# Altium footprint library PART.PcbLib: 407 footprints (part 11 of 26)
Each footprint in its own frame and in the unit in brackets; x right, y up, seen from the top. Pads: shape width x height; smd on the part's side, far side on the other; paste and mask are expansions set on the pad; w line width, h text height; cw(c..) or ccw(c..) is an arc to the next point about the centre after c.
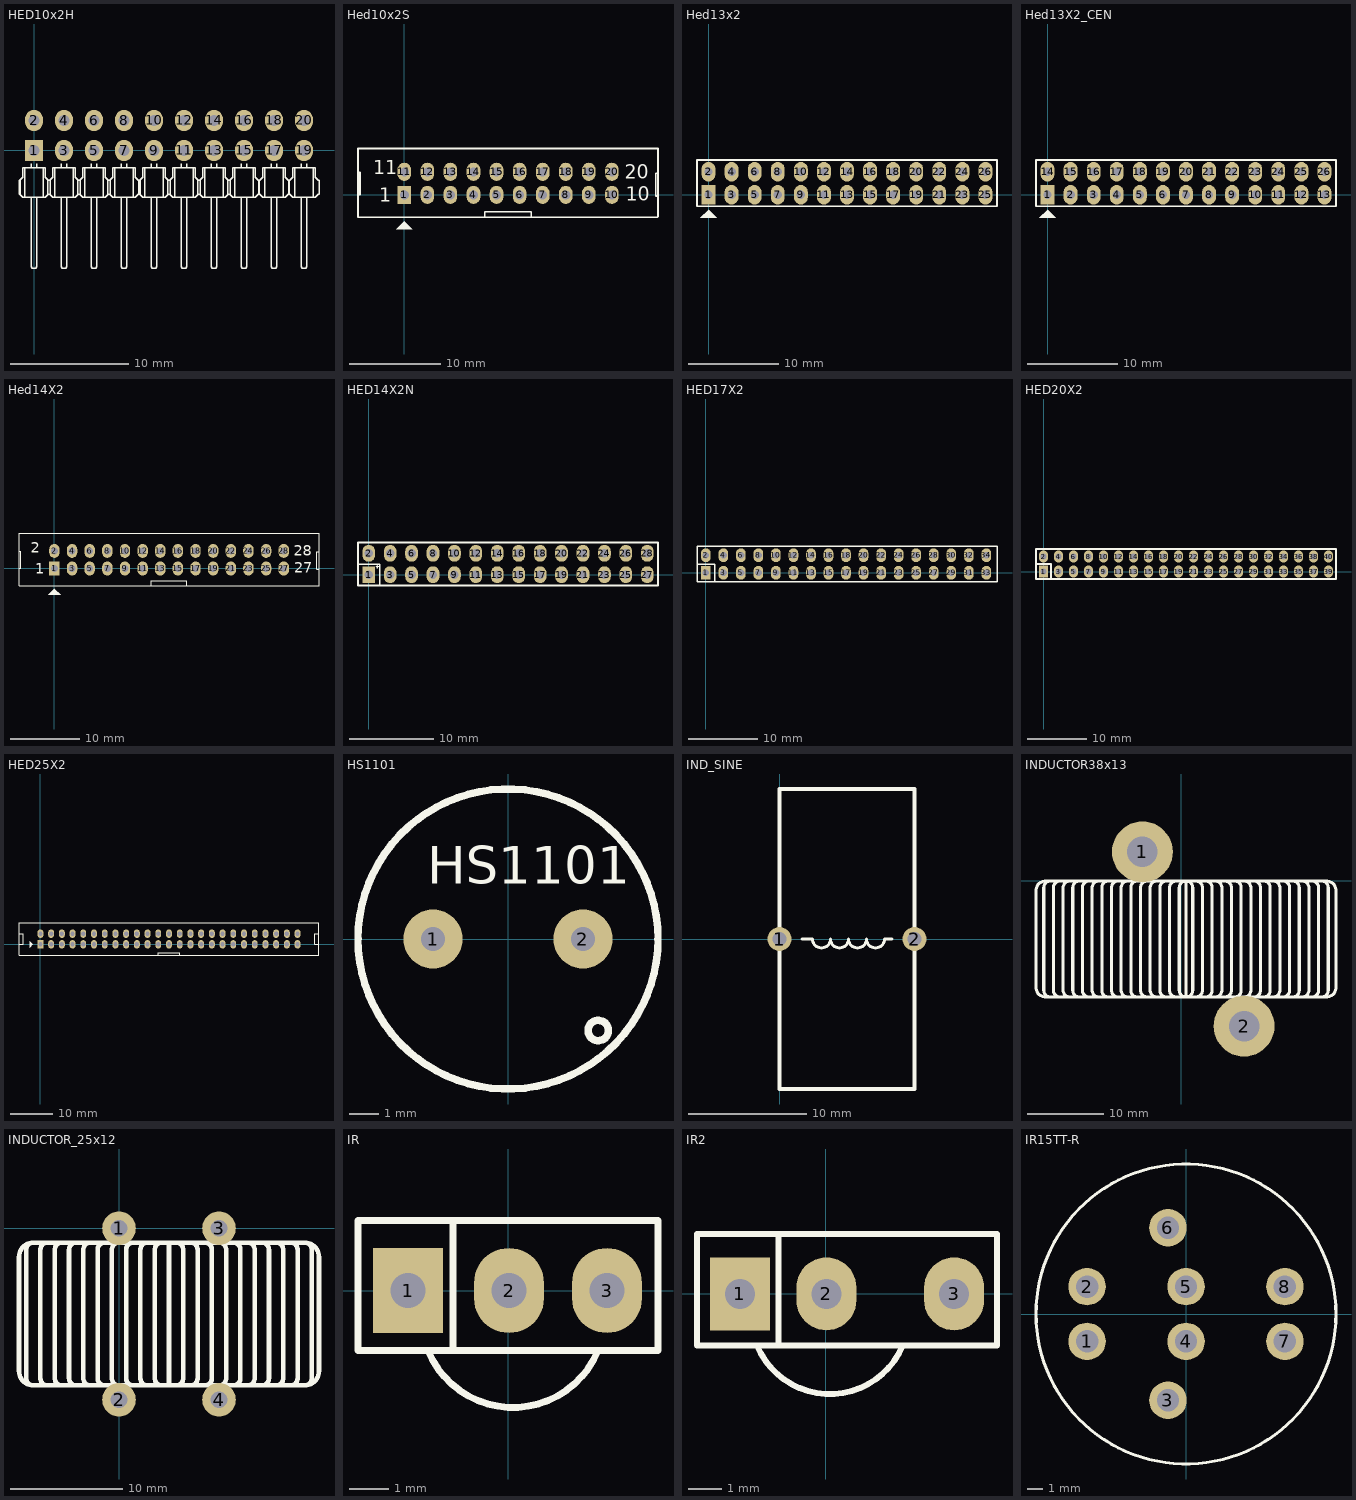
[diagram p10: the footprints below, top view; thin cyan lines are the x and y axes]

## HED10x2H [mm] "Connector; Header; 8x2 Position; Right Angle"
pads (20):
  rect 1.5x1.8 hole 0.9: 1(0,0)
  oval 1.5x1.8 hole 0.9: 2(0,2.54) 3(2.54,0) 4(2.54,2.54) 5(5.08,0) 6(5.08,2.54) 7(7.62,0) 8(7.62,2.54) 9(10.16,0) 10(10.16,2.54) 11(12.7,0) 12(12.7,2.54) 13(15.24,0) 14(15.24,2.54) 15(17.78,0) 16(17.78,2.54) 17(20.32,0) 18(20.32,2.54) 19(22.86,0) 20(22.86,2.54)
Top Overlay:
  drawing of 240 lines, arcs and shapes, not listed
3D body: height 5, standoff -2.23, extent -1.27,-10.024 8.89,2.726
3D body: height 5, standoff -2.23, extent 8.89,-10.024 19.05,2.726
3D body: height 5, standoff -2.23, extent 19.05,-10.024 21.59,2.726
3D body: height 5, standoff -2.23, extent 21.59,-10.024 24.13,2.726

## Hed10x2S [mm] "Header 10x2,20 pin, connecter"
height 7.62
pads (20):
  rect 1.5x2 hole 1: 1(0,0)
  oval 1.5x2 hole 1: 2(2.54,0) 3(5.08,0) 4(7.62,0) 5(10.16,0) 6(12.7,0) 7(15.24,0) 8(17.78,0) 9(20.32,0) 10(22.86,0) 11(0,2.54) 12(2.54,2.54) 13(5.08,2.54) 14(7.62,2.54) 15(10.16,2.54) 16(12.7,2.54) 17(15.24,2.54) 18(17.78,2.54) 19(20.32,2.54) 20(22.86,2.54)
Top Overlay:
  region: 0,-2.921 -0.889,-3.81 0.889,-3.81
  lines w0.178: -5.1,-0.025 -5.075,0 -4.875,0 -4.875,2.475 -5.1,2.475 ; 8.875,-2.475 8.875,-1.875 13.975,-1.875 13.975,-2.425 14.025,-2.475 ; 27.94,-0.127 27.686,-0.127 27.686,2.398 27.94,2.398 ; 27.94,5.08 27.94,-2.413 27.878,-2.475 -5.1,-2.475 -5.1,5.1 27.94,5.1
  text "20" at 24.257,1.778 h1.52
  text "10" at 24.384,-0.635 h1.52
  text "11" at -3.429,2.286 h1.52
  text "1" at -2.775,-0.75 h1.52

## Hed13x2 [mil] "Header 13x2,26 pin, connecter"
pads (26):
  rect 60x85 hole 36: 1(0,0)
  oval 60x85 hole 36: 2(0,100) 3(100,0) 4(100,100) 5(200,0) 6(200,100) 7(300,0) 8(300,100) 9(400,0) 10(400,100) 11(500,0) 12(500,100) 13(600,0) 14(600,100) 15(700,0) 16(700,100) 17(800,0) 18(800,100) 19(900,0) 20(900,100) 21(1000,0) 22(1000,100) 23(1100,0) 24(1100,100) 25(1200,0) 26(1200,100)
Top Overlay:
  region: 0,-65 -35,-100 35,-100
  lines w8: -50,-50 1250,-50 1250,150 -50,150 -50,-50

## Hed13X2_CEN [mil] "Header 13x2,26 pin, connecter"
pads (26):
  rect 60x85 hole 36: 1(0,0)
  oval 60x85 hole 36: 2(100,0) 3(200,0) 4(300,0) 5(400,0) 6(500,0) 7(600,0) 8(700,0) 9(800,0) 10(900,0) 11(1000,0) 12(1100,0) 13(1200,0) 14(0,100) 15(100,100) 16(200,100) 17(300,100) 18(400,100) 19(500,100) 20(600,100) 21(700,100) 22(800,100) 23(900,100) 24(1000,100) 25(1100,100) 26(1200,100)
Top Overlay:
  region: 0,-65 -35,-100 35,-100
  lines w8: -50,-50 -50,150 1250,150 1250,-50 -50,-50

## Hed14X2 [mm] "Header 14x2,28 pin, connecter"
height 7.62
pads (28):
  rect 1.5x2 hole 1: 1(0,0)
  oval 1.5x2 hole 1: 2(0,2.54) 3(2.54,0) 4(2.54,2.54) 5(5.08,0) 6(5.08,2.54) 7(7.62,0) 8(7.62,2.54) 9(10.16,0) 10(10.16,2.54) 11(12.7,0) 12(12.7,2.54) 13(15.24,0) 14(15.24,2.54) 15(17.78,0) 16(17.78,2.54) 17(20.32,0) 18(20.32,2.54) 19(22.86,0) 20(22.86,2.54) 21(25.4,0) 22(25.4,2.54) 23(27.94,0) 24(27.94,2.54) 25(30.48,0) 26(30.48,2.54) 27(33.02,0) 28(33.02,2.54)
Top Overlay:
  region: 0,-2.921 -0.889,-3.81 0.889,-3.81
  lines w0.178: -5.1,-0.025 -5.075,0 -4.875,0 -4.875,2.475 -5.1,2.475 ; -5.1,5.08 -5.1,-2.475 38.1,-2.475 ; -5.1,5.1 38.1,5.1 ; 13.955,-2.438 13.955,-1.778 19.055,-1.778 19.055,-2.464 ; 15.271,5.08 15.291,5.1 ; 38.024,-0.102 37.77,-0.102 37.77,2.423 38.024,2.423 ; 38.1,-2.388 38.1,5.105
  text "1" at -2.775,-0.75 h1.52
  text "2" at -3.429,2.286 h1.52
  text "28" at 34.442,1.803 h1.52
  text "27" at 34.569,-0.61 h1.52

## HED14X2N [mm] "Connector; Header; 14x2 Position"
pads (28):
  rect 1.5x2 hole 1: 1(0,0)
  oval 1.5x2 hole 1: 2(0,2.54) 3(2.54,0) 4(2.54,2.54) 5(5.08,0) 6(5.08,2.54) 7(7.62,0) 8(7.62,2.54) 9(10.16,0) 10(10.16,2.54) 11(12.7,0) 12(12.7,2.54) 13(15.24,0) 14(15.24,2.54) 15(17.78,0) 16(17.78,2.54) 17(20.32,0) 18(20.32,2.54) 19(22.86,0) 20(22.86,2.54) 21(25.4,0) 22(25.4,2.54) 23(27.94,0) 24(27.94,2.54) 25(30.48,0) 26(30.48,2.54) 27(33.02,0) 28(33.02,2.54)
Top Overlay:
  region: 0.94,0.749 0.94,0.927 0.813,0.927 1.016,1.13 1.219,0.927 1.092,0.927 1.092,0.749
  lines w0.178: -1.245,1.27 1.321,1.27 1.321,1.143 1.321,-1.245
  lines w0.2: -1.27,-1.27 -1.27,3.81 34.29,3.81 34.29,-1.27 -1.27,-1.27

## HED17X2 [mm]
pads (34):
  rect 1.4x2 hole 1: 1(0,0)
  oval 1.4x2 hole 1: 2(0,2.54) 3(2.54,0) 4(2.54,2.54) 5(5.08,0) 6(5.08,2.54) 7(7.62,0) 8(7.62,2.54) 9(10.16,0) 10(10.16,2.54) 11(12.7,0) 12(12.7,2.54) 13(15.24,0) 14(15.24,2.54) 15(17.78,0) 16(17.78,2.54) 17(20.32,0) 18(20.32,2.54) 19(22.86,0) 20(22.86,2.54) 21(25.4,0) 22(25.4,2.54) 23(27.94,0) 24(27.94,2.54) 25(30.48,0) 26(30.48,2.54) 27(33.02,0) 28(33.02,2.54) 29(35.56,0) 30(35.56,2.54) 31(38.1,0) 32(38.1,2.54) 33(40.64,0) 34(40.64,2.54)
Top Overlay:
  lines w0.203: -1.27,1.27 1.27,1.27 1.27,-1.27 ; -1.27,-1.27 -1.27,3.81 42.189,3.81 42.189,-1.27 -1.27,-1.27

## HED20X2 [mm]
pads (40):
  rect 1.6x2 hole 1: 1(0,0)
  oval 1.6x2 hole 1: 2(0,2.54) 3(2.54,0) 4(2.54,2.54) 5(5.08,0) 6(5.08,2.54) 7(7.62,0) 8(7.62,2.54) 9(10.16,0) 10(10.16,2.54) 11(12.7,0) 12(12.7,2.54) 13(15.24,0) 14(15.24,2.54) 15(17.78,0) 16(17.78,2.54) 17(20.32,0) 18(20.32,2.54) 19(22.86,0) 20(22.86,2.54) 21(25.4,0) 22(25.4,2.54) 23(27.94,0) 24(27.94,2.54) 25(30.48,0) 26(30.48,2.54) 27(33.02,0) 28(33.02,2.54) 29(35.56,0) 30(35.56,2.54) 31(38.1,0) 32(38.1,2.54) 33(40.64,0) 34(40.64,2.54) 35(43.18,0) 36(43.18,2.54) 37(45.72,0) 38(45.72,2.54) 39(48.26,0) 40(48.26,2.54)
Top Overlay:
  lines w0.305: -1.27,1.27 1.27,1.27 1.27,-1.27 ; -1.27,-1.27 49.53,-1.27 49.53,3.81 -1.27,3.81 -1.27,-1.27

## HED25X2 [mm]
pads (50):
  rect 1.4x2 hole 1: 1(0,0)
  oval 1.4x2 hole 1: 2(0,2.54) 3(2.54,0) 4(2.54,2.54) 5(5.08,0) 6(5.08,2.54) 7(7.62,0) 8(7.62,2.54) 9(10.16,0) 10(10.16,2.54) 11(12.7,0) 12(12.7,2.54) 13(15.24,0) 14(15.24,2.54) 15(17.78,0) 16(17.78,2.54) 17(20.32,0) 18(20.32,2.54) 19(22.86,0) 20(22.86,2.54) 21(25.4,0) 22(25.4,2.54) 23(27.94,0) 24(27.94,2.54) 25(30.48,0) 26(30.48,2.54) 27(33.02,0) 28(33.02,2.54) 29(35.56,0) 30(35.56,2.54) 31(38.1,0) 32(38.1,2.54) 33(40.64,0) 34(40.64,2.54) 35(43.18,0) 36(43.18,2.54) 37(45.72,0) 38(45.72,2.54) 39(48.26,0) 40(48.26,2.54) 41(50.8,0) 42(50.8,2.54) 43(53.34,0) 44(53.34,2.54) 45(55.88,0) 46(55.88,2.54) 47(58.42,0) 48(58.42,2.54) 49(60.96,0) 50(60.96,2.54)
Top Overlay:
  region: -2.565,0.749 -2.565,-0.8 -1.778,-0.013
  lines w0.203: -5.055,0.025 -4.089,0.025 -4.089,2.54 -5.055,2.54 ; 27.915,-2.489 27.915,-2.032 33.02,-2.032 33.045,-2.007 33.045,-2.54 ; 66.015,5.08 -5.08,5.08 -5.08,-2.54 66.04,-2.54 66.04,-2.515 66.04,5.08 ; 66.04,0.025 65.075,0.025 65.075,2.54 66.04,2.54

## HS1101 [mm] "Relative Humidity Sensor - pin to pin 200mil"
pads (2):
  round 2 hole 0.8: 1(-2.54,0) 2(2.54,0)
Top Overlay:
  circle w0.254: c3.058,-3.099 r0.345
  circle w0.254: c0,0 r5.08
  text "HS1101" at -2.743,1.88 h1.27

## IND_SINE [mil]
pads (2):
  round 80 hole 47.24: 1(0,0) 2(450,0)
Top Overlay:
  lines w10: 75,0 110,0 ccw(c140,0) 170,0 ccw(c200,0) 230,0 ccw(c260,0) 290,0 ccw(c320,0) 350,0 375,0
  lines w12: 0,-500 450,-500 450,500 0,500 0,0 0,-500

## INDUCTOR38x13 [mm]
pads (2):
  round 8 hole 4: 1(-5.08,3.81) 2(8.255,-19.05)
Top Overlay:
  lines w0.406: -17.145,-15.24 cw(c-17.145,-14.351) -18.034,-14.351 -18.034,-0.889 cw(c-17.145,-0.889) -17.145,0 ; -15.875,-15.24 cw(c-15.875,-14.351) -16.764,-14.351 -16.764,-0.889 cw(c-15.875,-0.889) -15.875,0 ; -14.986,-15.24 19.05,-15.24 ccw(c19.05,-13.97) 20.32,-13.97 20.32,-1.27 ccw(c19.05,-1.27) 19.05,0 0,0 -17.78,0 ccw(c-17.78,-1.27) -19.05,-1.27 -19.05,-13.97 ccw(c-17.78,-13.97) -17.78,-15.24 -14.732,-15.24 ; -14.605,-15.24 cw(c-14.605,-14.351) -15.494,-14.351 -15.494,-0.889 cw(c-14.605,-0.889) -14.605,0 ; -13.335,-15.24 cw(c-13.335,-14.351) -14.224,-14.351 -14.224,-0.889 cw(c-13.335,-0.889) -13.335,0 ; -12.065,-15.24 cw(c-12.065,-14.351) -12.954,-14.351 -12.954,-0.889 cw(c-12.065,-0.889) -12.065,0 ; -10.795,-15.24 cw(c-10.795,-14.351) -11.684,-14.351 -11.684,-0.889 cw(c-10.795,-0.889) -10.795,0 ; -9.525,-15.24 cw(c-9.525,-14.351) -10.414,-14.351 -10.414,-0.889 cw(c-9.525,-0.889) -9.525,0 ; -8.255,-15.24 cw(c-8.255,-14.351) -9.144,-14.351 -9.144,-0.889 cw(c-8.255,-0.889) -8.255,0 ; -6.985,-15.24 cw(c-6.985,-14.351) -7.874,-14.351 -7.874,-0.889 cw(c-6.985,-0.889) -6.985,0 ; -5.715,-15.24 cw(c-5.715,-14.351) -6.604,-14.351 -6.604,-0.889 cw(c-5.715,-0.889) -5.715,0 ; -4.445,-15.24 cw(c-4.445,-14.351) -5.334,-14.351 -5.334,-0.889 cw(c-4.445,-0.889) -4.445,0 ; -3.175,-15.24 cw(c-3.175,-14.351) -4.064,-14.351 -4.064,-0.889 cw(c-3.175,-0.889) -3.175,0 ; -1.905,-15.24 cw(c-1.905,-14.351) -2.794,-14.351 -2.794,-0.889 cw(c-1.905,-0.889) -1.905,0 ; -0.635,-15.24 cw(c-0.635,-14.351) -1.524,-14.351 -1.524,-0.889 cw(c-0.635,-0.889) -0.635,0 ; 1.905,-15.24 ccw(c1.905,-14.351) 2.794,-14.351 2.794,-0.889 ccw(c1.905,-0.889) 1.905,0 ; 3.175,-15.24 ccw(c3.175,-14.351) 4.064,-14.351 4.064,-0.889 ccw(c3.175,-0.889) 3.175,0 ; 4.445,-15.24 ccw(c4.445,-14.351) 5.334,-14.351 5.334,-0.889 ccw(c4.445,-0.889) 4.445,0 ; 5.715,-15.24 ccw(c5.715,-14.351) 6.604,-14.351 6.604,-0.889 ccw(c5.715,-0.889) 5.715,0 ; 6.985,-15.24 ccw(c6.985,-14.351) 7.874,-14.351 7.874,-0.889 ccw(c6.985,-0.889) 6.985,0 ; 8.255,-15.24 ccw(c8.255,-14.351) 9.144,-14.351 9.144,-0.889 ccw(c8.255,-0.889) 8.255,0 ; 9.525,-15.24 ccw(c9.525,-14.351) 10.414,-14.351 10.414,-0.889 ccw(c9.525,-0.889) 9.525,0 ; 10.795,-15.24 ccw(c10.795,-14.351) 11.684,-14.351 11.684,-0.889 ccw(c10.795,-0.889) 10.795,0 ; 12.065,-15.24 ccw(c12.065,-14.351) 12.954,-14.351 12.954,-0.889 ccw(c12.065,-0.889) 12.065,0 ; 13.335,-15.24 ccw(c13.335,-14.351) 14.224,-14.351 14.224,-0.889 ccw(c13.335,-0.889) 13.335,0 ; 14.605,-15.24 ccw(c14.605,-14.351) 15.494,-14.351 15.494,-0.889 ccw(c14.605,-0.889) 14.605,0 ; 15.875,-15.24 ccw(c15.875,-14.351) 16.764,-14.351 16.764,-0.889 ccw(c15.875,-0.889) 15.875,0 ; 17.145,-15.24 ccw(c17.145,-14.351) 18.034,-14.351 18.034,-0.889 ccw(c17.145,-0.889) 17.145,0 ; 18.415,-15.24 ccw(c18.415,-14.351) 19.304,-14.351 19.304,-0.889 ccw(c18.415,-0.889) 18.415,0 ; 0.635,-15.24 cw(c0.635,-14.351) -0.254,-14.351 -0.254,-0.889 cw(c0.635,-0.889) 0.635,0 ; 0.635,-15.24 ccw(c0.635,-14.351) 1.524,-14.351 1.524,-0.889 ccw(c0.635,-0.889) 0.635,0 ; 0.635,-15.24 0.635,0

## INDUCTOR_25x12 [mm]
pads (4):
  round 3 hole 1.5: 1(0,0) 2(0,-15.24) 3(8.89,0) 4(8.89,-15.24)
Top Overlay:
  lines w0.406: -6.35,-13.97 cw(c-6.35,-13.335) -6.985,-13.335 -6.985,-1.905 cw(c-6.35,-1.905) -6.35,-1.27 ; -5.08,-13.97 cw(c-5.08,-13.335) -5.715,-13.335 -5.715,-1.905 cw(c-5.08,-1.905) -5.08,-1.27 ; -3.81,-13.97 cw(c-3.81,-13.335) -4.445,-13.335 -4.445,-1.905 cw(c-3.81,-1.905) -3.81,-1.27 ; -2.54,-13.97 cw(c-2.54,-13.335) -3.175,-13.335 -3.175,-1.905 cw(c-2.54,-1.905) -2.54,-1.27 ; -1.27,-13.97 cw(c-1.27,-13.335) -1.905,-13.335 -1.905,-1.905 cw(c-1.27,-1.905) -1.27,-1.27 ; 0,-13.97 cw(c0,-13.335) -0.635,-13.335 -0.635,-1.905 cw(c0,-1.905) 0,-1.27 ; 1.27,-13.97 cw(c1.27,-13.335) 0.635,-13.335 0.635,-1.905 cw(c1.27,-1.905) 1.27,-1.27 ; 2.54,-13.97 cw(c2.54,-13.335) 1.905,-13.335 1.905,-1.905 cw(c2.54,-1.905) 2.54,-1.27 ; 3.81,-13.97 cw(c3.81,-13.335) 3.175,-13.335 3.175,-1.905 cw(c3.81,-1.905) 3.81,-1.27 ; 4.445,-13.97 4.445,-1.397 ; 5.08,-13.97 ccw(c5.08,-13.335) 5.715,-13.335 5.715,-1.905 ccw(c5.08,-1.905) 5.08,-1.27 ; 6.35,-13.97 ccw(c6.35,-13.335) 6.985,-13.335 6.985,-1.905 ccw(c6.35,-1.905) 6.35,-1.27 ; 7.62,-13.97 ccw(c7.62,-13.335) 8.255,-13.335 8.255,-1.905 ccw(c7.62,-1.905) 7.62,-1.27 ; 8.89,-13.97 ccw(c8.89,-13.335) 9.525,-13.335 9.525,-1.905 ccw(c8.89,-1.905) 8.89,-1.27 ; 10.16,-13.97 ccw(c10.16,-13.335) 10.795,-13.335 10.795,-1.905 ccw(c10.16,-1.905) 10.16,-1.27 ; 11.43,-13.97 ccw(c11.43,-13.335) 12.065,-13.335 12.065,-1.905 ccw(c11.43,-1.905) 11.43,-1.27 ; 12.7,-13.97 ccw(c12.7,-13.335) 13.335,-13.335 13.335,-1.905 ccw(c12.7,-1.905) 12.7,-1.27 ; 13.97,-13.97 ccw(c13.97,-13.335) 14.605,-13.335 14.605,-1.905 ccw(c13.97,-1.905) 13.97,-1.27 ; 15.24,-13.97 ccw(c15.24,-13.335) 15.875,-13.335 15.875,-1.905 ccw(c15.24,-1.905) 15.24,-1.27 ; -7.62,-13.97 cw(c-7.62,-12.7) -8.89,-12.7 -8.89,-2.54 cw(c-7.62,-2.54) -7.62,-1.27 ; -7.62,-13.97 cw(c-7.62,-13.335) -8.255,-13.335 -8.255,-1.905 cw(c-7.62,-1.905) -7.62,-1.27 ; -7.62,-13.97 16.51,-13.97 ; -7.62,-1.27 2.54,-1.27 ; 2.54,-1.27 16.51,-1.27 ; 16.51,-13.97 ccw(c16.51,-12.7) 17.78,-12.7 17.78,-2.54 ccw(c16.51,-2.54) 16.51,-1.27 ; 16.51,-13.97 ccw(c16.51,-13.335) 17.145,-13.335 17.145,-1.905 ccw(c16.51,-1.905) 16.51,-1.27

## IR [mil] "Receiver Infared IC"
height 200
pads (3):
  rect 70x85 hole 35: 1(-100,0)
  oval 70x85 hole 35: 2(1,0) 3(99,0)
Top Overlay:
  lines w7: -80,-60 ccw(c5,-25) 90,-60 ; -55,-60 -55,70 ; -150,-60 -150,70 150,70 150,-60 -150,-60

## IR2 [mil] "Receiver Infared IC"
height 200
pads (3):
  rect 70x85 hole 35: 1(-100,0)
  oval 70x85 hole 35: 2(1,0) 3(150,0)
Top Overlay:
  lines w7: -80,-60 ccw(c5,-25) 90,-60 ; -55,-60 -55,70 ; -150,-60 -150,70 200,70 200,-60 -150,-60

## IR15TT-R [mm] "8 PIN"
pads (8):
  round 2.5 hole 1.5: 1(-6.6,-1.825) 2(-6.6,1.825) 3(-1.2,-5.75) 4(0,-1.825) 5(0,1.825) 6(-1.2,5.75) 7(6.6,-1.825) 8(6.6,1.825)
Top Overlay:
  circle w0.203: c0,0 r10
3D body: height 19.1, standoff 17.6, extent -6.858,-6.858 6.888,6.915
3D body: height 19, standoff 0, extent -9.906,-10.033 10.015,9.928